# Altium footprint library dAir.PcbLib: 34 footprints (part 3 of 3)
Each footprint in its own frame and in the unit in brackets; x right, y up, seen from the top. Pads: shape width x height; smd on the part's side, far side on the other; paste and mask are expansions set on the pad; w line width, h text height; cw(c..) or ccw(c..) is an arc to the next point about the centre after c.
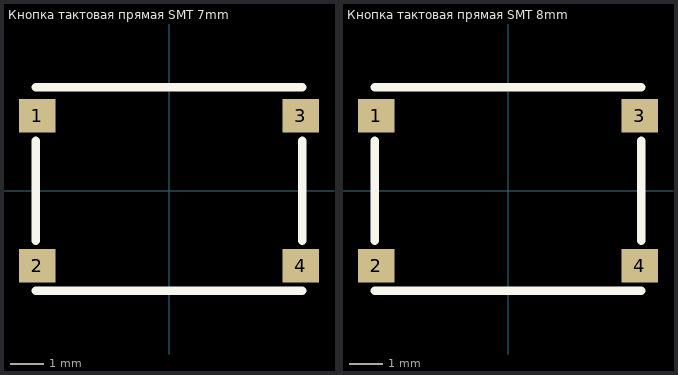
[diagram p2: the footprints below, top view; thin cyan lines are the x and y axes]

## Кнопка тактовая прямая SMT 7mm [mm]
pads (4):
  rect 1.1x1 smd: 1(-3.95,2.25) 2(-3.95,-2.25) 3(3.95,2.25) 4(3.95,-2.25)
Top Overlay:
  lines w0.254: -4,-3 4,-3 ; -4,-1.5 -4,1.5 ; -4,3.1 4,3.1 ; 4,-1.5 4,1.5
3D body "TS6-SMT_H-7.0.step": height 7, standoff 0, extent -4,-3 4,3

## Кнопка тактовая прямая SMT 8mm [mm]
pads (4):
  rect 1.1x1 smd: 1(-3.95,2.25) 2(-3.95,-2.25) 3(3.95,2.25) 4(3.95,-2.25)
Top Overlay:
  lines w0.254: -4,-3 4,-3 ; -4,-1.5 -4,1.5 ; -4,3.1 4,3.1 ; 4,-1.5 4,1.5
3D body "TS6-SMT_H-8.0.step": height 8, standoff 0, extent -4,-3 4,3